# Altium footprint library B105connectors.PcbLib: 71 footprints (part 3 of 5)
Each footprint in its own frame and in the unit in brackets; x right, y up, seen from the top. Pads: shape width x height; smd on the part's side, far side on the other; paste and mask are expansions set on the pad; w line width, h text height; cw(c..) or ccw(c..) is an arc to the next point about the centre after c.
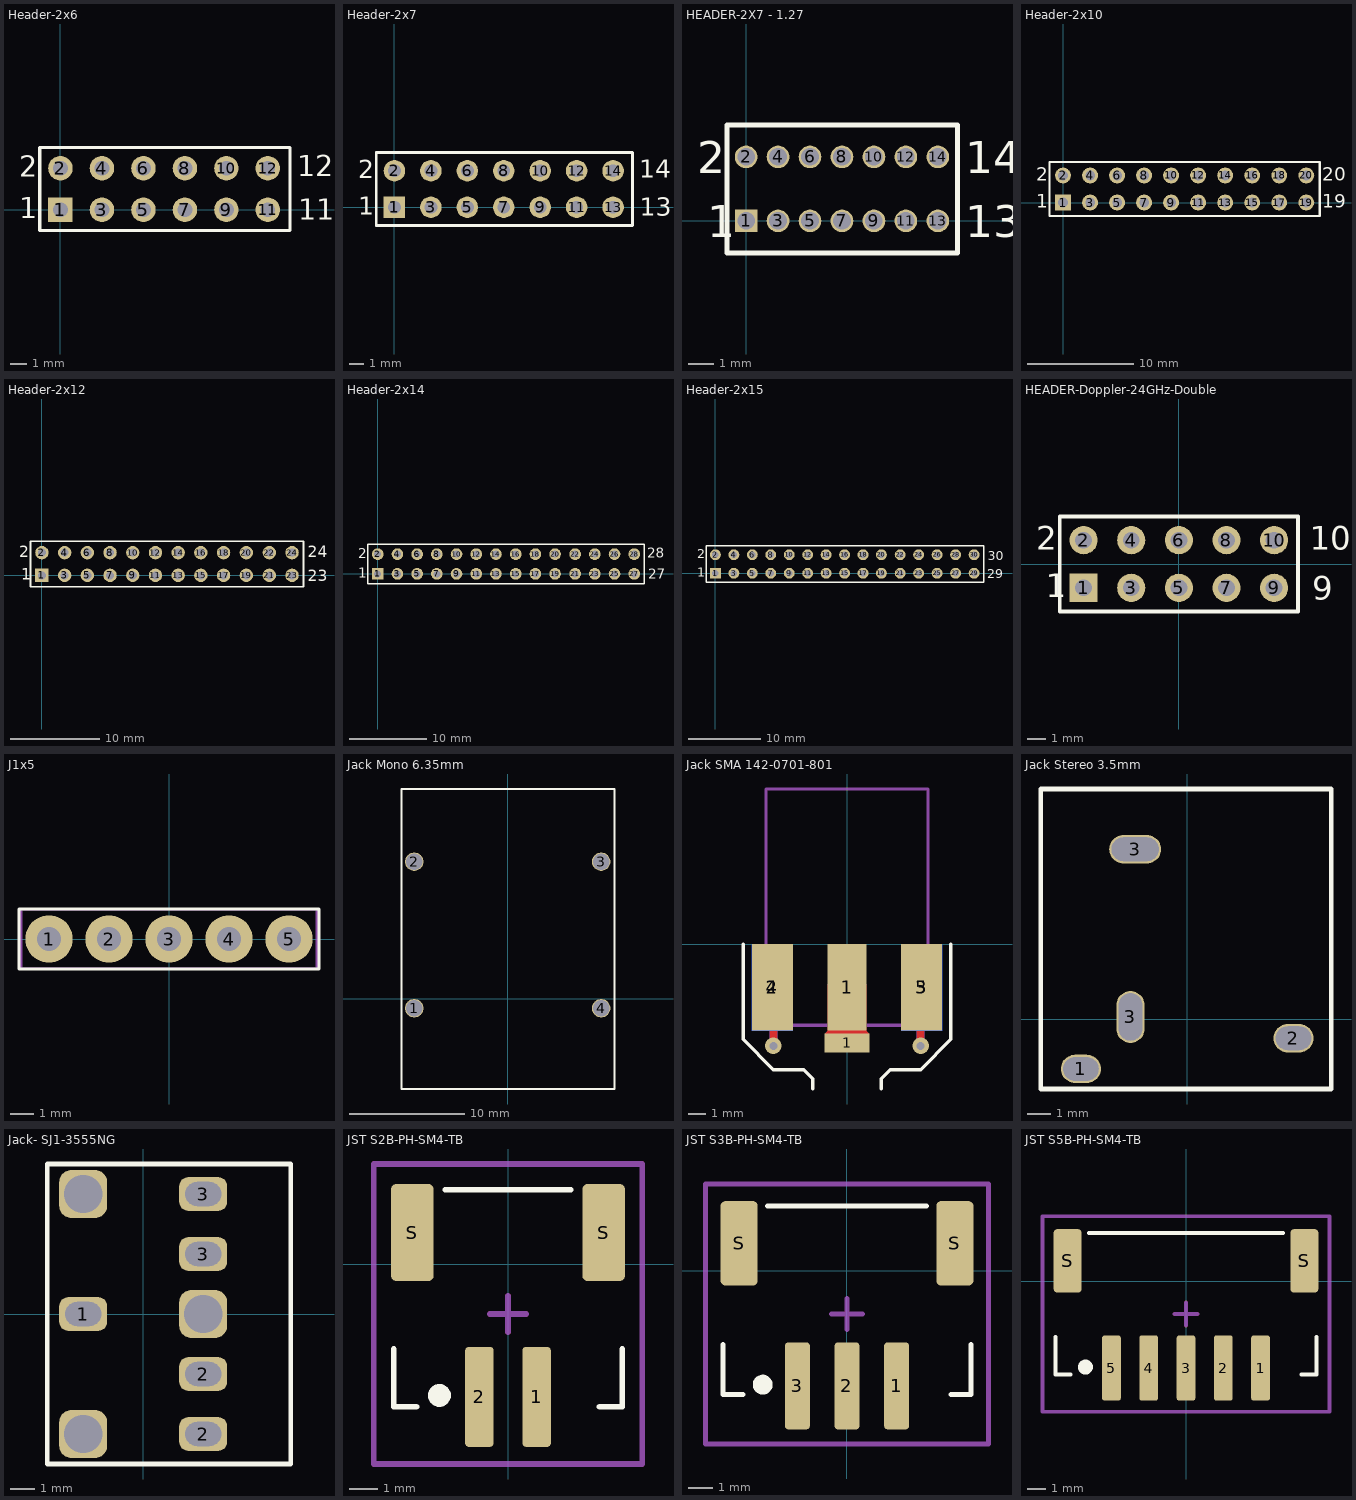
[diagram p2: the footprints below, top view; thin cyan lines are the x and y axes]

## Header-2x6 [mm] "Connector; Header; 6x2 Position"
pads (12):
  rect 1.5x1.5 hole 0.9: 1(0,0)
  round 1.5 hole 0.9: 2(0,2.54) 3(2.54,0) 4(2.54,2.54) 5(5.08,0) 6(5.08,2.54) 7(7.62,0) 8(7.62,2.54) 9(10.16,0) 10(10.16,2.54) 11(12.7,0) 12(12.7,2.54)
Top Overlay:
  lines w0.2: -1.27,-1.27 -1.27,3.81 0.635,3.81 14.06,3.81 14.06,-1.27 0.635,-1.27 -1.27,-1.27
  text "2" at -2.54,2.032 h1.27
  text "1" at -2.54,-0.508 h1.27
  text "11" at 14.56,-0.6 h1.27
  text "12" at 14.51,2.05 h1.27
3D body "User Library-Header_Male_1Pin.STEP": height 8.54, standoff -3, extent 8.88,1.26 11.42,3.75
3D body "User Library-Header_Male_1Pin.STEP": height 8.54, standoff -3, extent 11.43,1.26 13.97,3.75
3D body "User Library-Header_Male_1Pin.STEP": height 8.54, standoff -3, extent 8.88,-1.24 11.42,1.25
3D body "User Library-Header_Male_1Pin.STEP": height 8.54, standoff -3, extent 11.43,-1.24 13.97,1.25
3D body "User Library-Header_Male_1Pin.STEP": height 8.54, standoff -3, extent 3.78,1.26 6.32,3.75
3D body "User Library-Header_Male_1Pin.STEP": height 8.54, standoff -3, extent 6.33,1.26 8.87,3.75
3D body "User Library-Header_Male_1Pin.STEP": height 8.54, standoff -3, extent 3.78,-1.24 6.32,1.25
3D body "User Library-Header_Male_1Pin.STEP": height 8.54, standoff -3, extent 6.33,-1.24 8.87,1.25
3D body "User Library-Header_Male_1Pin.STEP": height 8.54, standoff -3, extent -1.32,1.26 1.22,3.75
3D body "User Library-Header_Male_1Pin.STEP": height 8.54, standoff -3, extent 1.23,1.26 3.77,3.75
3D body "User Library-Header_Male_1Pin.STEP": height 8.54, standoff -3, extent -1.32,-1.24 1.22,1.25
3D body "User Library-Header_Male_1Pin.STEP": height 8.54, standoff -3, extent 1.23,-1.24 3.77,1.25

## Header-2x7 [mm] "Connector; Header; 7x2 Position"
pads (14):
  rect 1.5x1.5 hole 0.9: 1(0,0)
  round 1.5 hole 0.9: 2(0,2.54) 3(2.54,0) 4(2.54,2.54) 5(5.08,0) 6(5.08,2.54) 7(7.62,0) 8(7.62,2.54) 9(10.16,0) 10(10.16,2.54) 11(12.7,0) 12(12.7,2.54) 13(15.24,0) 14(15.24,2.54)
Top Overlay:
  lines w0.2: -1.27,-1.27 -1.27,3.81 0.635,3.81 16.6,3.81 16.6,-1.27 0.635,-1.27 -1.27,-1.27
  text "2" at -2.54,2.032 h1.27
  text "1" at -2.54,-0.508 h1.27
  text "13" at 17.1,-0.6 h1.27
  text "14" at 17.05,2.05 h1.27
3D body "User Library-Header_Male_1Pin.STEP": height 8.54, standoff -3, extent 13.98,1.26 16.52,3.75
3D body "User Library-Header_Male_1Pin.STEP": height 8.54, standoff -3, extent 13.98,-1.24 16.52,1.25
3D body "User Library-Header_Male_1Pin.STEP": height 8.54, standoff -3, extent 8.88,1.26 11.42,3.75
3D body "User Library-Header_Male_1Pin.STEP": height 8.54, standoff -3, extent 11.43,1.26 13.97,3.75
3D body "User Library-Header_Male_1Pin.STEP": height 8.54, standoff -3, extent 8.88,-1.24 11.42,1.25
3D body "User Library-Header_Male_1Pin.STEP": height 8.54, standoff -3, extent 11.43,-1.24 13.97,1.25
3D body "User Library-Header_Male_1Pin.STEP": height 8.54, standoff -3, extent 3.78,1.26 6.32,3.75
3D body "User Library-Header_Male_1Pin.STEP": height 8.54, standoff -3, extent 6.33,1.26 8.87,3.75
3D body "User Library-Header_Male_1Pin.STEP": height 8.54, standoff -3, extent 3.78,-1.24 6.32,1.25
3D body "User Library-Header_Male_1Pin.STEP": height 8.54, standoff -3, extent 6.33,-1.24 8.87,1.25
3D body "User Library-Header_Male_1Pin.STEP": height 8.54, standoff -3, extent -1.32,1.26 1.22,3.75
3D body "User Library-Header_Male_1Pin.STEP": height 8.54, standoff -3, extent 1.23,1.26 3.77,3.75
3D body "User Library-Header_Male_1Pin.STEP": height 8.54, standoff -3, extent -1.32,-1.24 1.22,1.25
3D body "User Library-Header_Male_1Pin.STEP": height 8.54, standoff -3, extent 1.23,-1.24 3.77,1.25

## HEADER-2X7 - 1.27 [mm] "Connector; Header; 4x2 Position"
pads (14):
  rect 0.9x0.9 hole 0.7: 1(0,0)
  round 0.9 hole 0.7: 2(0,2.54) 3(1.27,0) 4(1.27,2.54) 5(2.54,0) 6(2.54,2.54) 7(3.81,0) 8(3.81,2.54) 9(5.08,0) 10(5.08,2.54) 11(6.35,0) 12(6.35,2.54) 13(7.62,0) 14(7.62,2.54)
Top Overlay:
  lines w0.2: -0.75,-1.27 -0.75,3.8 8.4,3.8 8.4,-1.27 -0.75,-1.27
  text "14" at 8.7,1.9 h1.27
  text "13" at 8.7,-0.65 h1.27
  text "1" at -1.55,-0.65 h1.27
  text "2" at -1.95,1.9 h1.27

## Header-2x10 [mm] "Connector; Header; 10x2 Position"
pads (20):
  rect 1.5x1.5 hole 0.9: 1(0,0)
  round 1.5 hole 0.9: 2(0,2.54) 3(2.54,0) 4(2.54,2.54) 5(5.08,0) 6(5.08,2.54) 7(7.62,0) 8(7.62,2.54) 9(10.16,0) 10(10.16,2.54) 11(12.7,0) 12(12.7,2.54) 13(15.24,0) 14(15.24,2.54) 15(17.78,0) 16(17.78,2.54) 17(20.32,0) 18(20.32,2.54) 19(22.86,0) 20(22.86,2.54)
Top Overlay:
  lines w0.2: -1.27,-1.27 0.635,-1.27 24.13,-1.27 24.13,3.81 0.635,3.81 -1.27,3.81 -1.27,-1.27
  text "20" at 24.384,2.032 h1.27
  text "19" at 24.384,-0.508 h1.27
  text "1" at -2.54,-0.508 h1.27
  text "2" at -2.54,2.032 h1.27
3D body "User Library-Header_Male_1Pin.STEP": height 8.54, standoff -3, extent 1.23,-1.24 3.77,1.25
3D body "User Library-Header_Male_1Pin.STEP": height 8.54, standoff -3, extent -1.32,-1.24 1.22,1.25
3D body "User Library-Header_Male_1Pin.STEP": height 8.54, standoff -3, extent 1.23,1.26 3.77,3.75
3D body "User Library-Header_Male_1Pin.STEP": height 8.54, standoff -3, extent -1.32,1.26 1.22,3.75
3D body "User Library-Header_Male_1Pin.STEP": height 8.54, standoff -3, extent 6.33,-1.24 8.87,1.25
3D body "User Library-Header_Male_1Pin.STEP": height 8.54, standoff -3, extent 3.78,-1.24 6.32,1.25
3D body "User Library-Header_Male_1Pin.STEP": height 8.54, standoff -3, extent 6.33,1.26 8.87,3.75
3D body "User Library-Header_Male_1Pin.STEP": height 8.54, standoff -3, extent 3.78,1.26 6.32,3.75
3D body "User Library-Header_Male_1Pin.STEP": height 8.54, standoff -3, extent 11.43,-1.24 13.97,1.25
3D body "User Library-Header_Male_1Pin.STEP": height 8.54, standoff -3, extent 8.88,-1.24 11.42,1.25
3D body "User Library-Header_Male_1Pin.STEP": height 8.54, standoff -3, extent 11.43,1.26 13.97,3.75
3D body "User Library-Header_Male_1Pin.STEP": height 8.54, standoff -3, extent 8.88,1.26 11.42,3.75
3D body "User Library-Header_Male_1Pin.STEP": height 8.54, standoff -3, extent 16.53,-1.24 19.07,1.25
3D body "User Library-Header_Male_1Pin.STEP": height 8.54, standoff -3, extent 13.98,-1.24 16.52,1.25
3D body "User Library-Header_Male_1Pin.STEP": height 8.54, standoff -3, extent 16.53,1.26 19.07,3.75
3D body "User Library-Header_Male_1Pin.STEP": height 8.54, standoff -3, extent 13.98,1.26 16.52,3.75
3D body "User Library-Header_Male_1Pin.STEP": height 8.54, standoff -3, extent 21.63,-1.24 24.17,1.25
3D body "User Library-Header_Male_1Pin.STEP": height 8.54, standoff -3, extent 19.08,-1.24 21.62,1.25
3D body "User Library-Header_Male_1Pin.STEP": height 8.54, standoff -3, extent 21.63,1.26 24.17,3.75
3D body "User Library-Header_Male_1Pin.STEP": height 8.54, standoff -3, extent 19.08,1.26 21.62,3.75

## Header-2x12 [mm] "Connector; Header; 12x2 Position"
pads (24):
  rect 1.5x1.5 hole 0.9: 1(0,0)
  round 1.5 hole 0.9: 2(0,2.54) 3(2.54,0) 4(2.54,2.54) 5(5.08,0) 6(5.08,2.54) 7(7.62,0) 8(7.62,2.54) 9(10.16,0) 10(10.16,2.54) 11(12.7,0) 12(12.7,2.54) 13(15.24,0) 14(15.24,2.54) 15(17.78,0) 16(17.78,2.54) 17(20.32,0) 18(20.32,2.54) 19(22.86,0) 20(22.86,2.54) 21(25.44,0) 22(25.44,2.54) 23(27.98,0) 24(27.98,2.54)
Top Overlay:
  lines w0.2: -1.27,-1.27 -1.27,3.81 0.635,3.81 29.275,3.81 29.275,-1.27 0.635,-1.27 -1.27,-1.27
  text "2" at -2.565,2.032 h1.27
  text "1" at -2.34,-0.508 h1.27
  text "23" at 29.725,-0.65 h1.27
  text "24" at 29.725,2.05 h1.27
3D body "User Library-Header_Male_1Pin.STEP": height 8.54, standoff -3, extent 19.08,1.26 21.62,3.75
3D body "User Library-Header_Male_1Pin.STEP": height 8.54, standoff -3, extent 21.63,1.26 24.17,3.75
3D body "User Library-Header_Male_1Pin.STEP": height 8.54, standoff -3, extent 19.08,-1.24 21.62,1.25
3D body "User Library-Header_Male_1Pin.STEP": height 8.54, standoff -3, extent 21.63,-1.24 24.17,1.25
3D body "User Library-Header_Male_1Pin.STEP": height 8.54, standoff -3, extent 13.98,1.26 16.52,3.75
3D body "User Library-Header_Male_1Pin.STEP": height 8.54, standoff -3, extent 16.53,1.26 19.07,3.75
3D body "User Library-Header_Male_1Pin.STEP": height 8.54, standoff -3, extent 13.98,-1.24 16.52,1.25
3D body "User Library-Header_Male_1Pin.STEP": height 8.54, standoff -3, extent 16.53,-1.24 19.07,1.25
3D body "User Library-Header_Male_1Pin.STEP": height 8.54, standoff -3, extent 8.88,1.26 11.42,3.75
3D body "User Library-Header_Male_1Pin.STEP": height 8.54, standoff -3, extent 11.43,1.26 13.97,3.75
3D body "User Library-Header_Male_1Pin.STEP": height 8.54, standoff -3, extent 8.88,-1.24 11.42,1.25
3D body "User Library-Header_Male_1Pin.STEP": height 8.54, standoff -3, extent 11.43,-1.24 13.97,1.25
3D body "User Library-Header_Male_1Pin.STEP": height 8.54, standoff -3, extent 3.78,1.26 6.32,3.75
3D body "User Library-Header_Male_1Pin.STEP": height 8.54, standoff -3, extent 6.33,1.26 8.87,3.75
3D body "User Library-Header_Male_1Pin.STEP": height 8.54, standoff -3, extent 3.78,-1.24 6.32,1.25
3D body "User Library-Header_Male_1Pin.STEP": height 8.54, standoff -3, extent 6.33,-1.24 8.87,1.25
3D body "User Library-Header_Male_1Pin.STEP": height 8.54, standoff -3, extent -1.32,1.26 1.22,3.75
3D body "User Library-Header_Male_1Pin.STEP": height 8.54, standoff -3, extent 1.23,1.26 3.77,3.75
3D body "User Library-Header_Male_1Pin.STEP": height 8.54, standoff -3, extent -1.32,-1.24 1.22,1.25
3D body "User Library-Header_Male_1Pin.STEP": height 8.54, standoff -3, extent 1.23,-1.24 3.77,1.25
3D body "User Library-Header_Male_1Pin.STEP": height 8.54, standoff -3, extent 26.73,-1.24 29.27,1.25
3D body "User Library-Header_Male_1Pin.STEP": height 8.54, standoff -3, extent 24.18,-1.24 26.72,1.25
3D body "User Library-Header_Male_1Pin.STEP": height 8.54, standoff -3, extent 26.73,1.26 29.27,3.75
3D body "User Library-Header_Male_1Pin.STEP": height 8.54, standoff -3, extent 24.18,1.26 26.72,3.75

## Header-2x14 [mm] "Connector; Header; 10x2 Position"
pads (28):
  rect 1.5x1.5 hole 0.9: 1(0,0)
  round 1.5 hole 0.9: 2(0,2.54) 3(2.54,0) 4(2.54,2.54) 5(5.08,0) 6(5.08,2.54) 7(7.62,0) 8(7.62,2.54) 9(10.16,0) 10(10.16,2.54) 11(12.7,0) 12(12.7,2.54) 13(15.24,0) 14(15.24,2.54) 15(17.78,0) 16(17.78,2.54) 17(20.32,0) 18(20.32,2.54) 19(22.86,0) 20(22.86,2.54) 21(25.44,0) 22(25.44,2.54) 23(27.98,0) 24(27.98,2.54) 25(30.52,0) 26(30.52,2.54) 27(33.06,0) 28(33.06,2.54)
Top Overlay:
  lines w0.2: 34.3,3.81 0.635,3.81 -1.27,3.81 -1.27,-1.27 0.635,-1.27 34.33,-1.27 34.33,3.81
  text "2" at -2.54,2.032 h1.27
  text "1" at -2.54,-0.508 h1.27
  text "27" at 34.85,-0.65 h1.27
  text "28" at 34.75,2.05 h1.27
3D body "User Library-Header_Male_1Pin.STEP": height 8.54, standoff -3, extent 19.08,1.26 21.62,3.75
3D body "User Library-Header_Male_1Pin.STEP": height 8.54, standoff -3, extent 21.63,1.26 24.17,3.75
3D body "User Library-Header_Male_1Pin.STEP": height 8.54, standoff -3, extent 19.08,-1.24 21.62,1.25
3D body "User Library-Header_Male_1Pin.STEP": height 8.54, standoff -3, extent 21.63,-1.24 24.17,1.25
3D body "User Library-Header_Male_1Pin.STEP": height 8.54, standoff -3, extent 13.98,1.26 16.52,3.75
3D body "User Library-Header_Male_1Pin.STEP": height 8.54, standoff -3, extent 16.53,1.26 19.07,3.75
3D body "User Library-Header_Male_1Pin.STEP": height 8.54, standoff -3, extent 13.98,-1.24 16.52,1.25
3D body "User Library-Header_Male_1Pin.STEP": height 8.54, standoff -3, extent 16.53,-1.24 19.07,1.25
3D body "User Library-Header_Male_1Pin.STEP": height 8.54, standoff -3, extent 8.88,1.26 11.42,3.75
3D body "User Library-Header_Male_1Pin.STEP": height 8.54, standoff -3, extent 11.43,1.26 13.97,3.75
3D body "User Library-Header_Male_1Pin.STEP": height 8.54, standoff -3, extent 8.88,-1.24 11.42,1.25
3D body "User Library-Header_Male_1Pin.STEP": height 8.54, standoff -3, extent 11.43,-1.24 13.97,1.25
3D body "User Library-Header_Male_1Pin.STEP": height 8.54, standoff -3, extent 3.78,1.26 6.32,3.75
3D body "User Library-Header_Male_1Pin.STEP": height 8.54, standoff -3, extent 6.33,1.26 8.87,3.75
3D body "User Library-Header_Male_1Pin.STEP": height 8.54, standoff -3, extent 3.78,-1.24 6.32,1.25
3D body "User Library-Header_Male_1Pin.STEP": height 8.54, standoff -3, extent 6.33,-1.24 8.87,1.25
3D body "User Library-Header_Male_1Pin.STEP": height 8.54, standoff -3, extent -1.32,1.26 1.22,3.75
3D body "User Library-Header_Male_1Pin.STEP": height 8.54, standoff -3, extent 1.23,1.26 3.77,3.75
3D body "User Library-Header_Male_1Pin.STEP": height 8.54, standoff -3, extent -1.32,-1.24 1.22,1.25
3D body "User Library-Header_Male_1Pin.STEP": height 8.54, standoff -3, extent 1.23,-1.24 3.77,1.25
3D body "User Library-Header_Male_1Pin.STEP": height 8.54, standoff -3, extent 26.73,-1.24 29.27,1.25
3D body "User Library-Header_Male_1Pin.STEP": height 8.54, standoff -3, extent 24.18,-1.24 26.72,1.25
3D body "User Library-Header_Male_1Pin.STEP": height 8.54, standoff -3, extent 26.73,1.26 29.27,3.75
3D body "User Library-Header_Male_1Pin.STEP": height 8.54, standoff -3, extent 24.18,1.26 26.72,3.75
3D body "User Library-Header_Male_1Pin.STEP": height 8.54, standoff -3, extent 31.83,-1.24 34.37,1.25
3D body "User Library-Header_Male_1Pin.STEP": height 8.54, standoff -3, extent 29.28,-1.24 31.82,1.25
3D body "User Library-Header_Male_1Pin.STEP": height 8.54, standoff -3, extent 31.83,1.26 34.37,3.75
3D body "User Library-Header_Male_1Pin.STEP": height 8.54, standoff -3, extent 29.28,1.26 31.82,3.75

## Header-2x15 [mm] "Connector; Header; 10x2 Position"
pads (30):
  rect 1.5x1.5 hole 0.9: 1(0,0)
  round 1.5 hole 0.9: 2(0,2.54) 3(2.54,0) 4(2.54,2.54) 5(5.08,0) 6(5.08,2.54) 7(7.62,0) 8(7.62,2.54) 9(10.16,0) 10(10.16,2.54) 11(12.7,0) 12(12.7,2.54) 13(15.24,0) 14(15.24,2.54) 15(17.78,0) 16(17.78,2.54) 17(20.32,0) 18(20.32,2.54) 19(22.86,0) 20(22.86,2.54) 21(25.44,0) 22(25.44,2.54) 23(27.98,0) 24(27.98,2.54) 25(30.52,0) 26(30.52,2.54) 27(33.06,0) 28(33.06,2.54) 29(35.61,0) 30(35.61,2.54)
Top Overlay:
  lines w0.2: -1.27,-1.27 0.635,-1.27 36.95,-1.27 36.95,3.81 0.635,3.81 -1.27,3.81 -1.27,-1.27
  text "30" at 37.5,1.8 h1.27
  text "29" at 37.45,-0.7 h1.27
  text "1" at -2.54,-0.508 h1.27
  text "2" at -2.54,2.032 h1.27
3D body "User Library-Header_Male_1Pin.STEP": height 8.54, standoff -3, extent 34.38,-1.24 36.92,1.25
3D body "User Library-Header_Male_1Pin.STEP": height 8.54, standoff -3, extent 34.38,1.26 36.92,3.75
3D body "User Library-Header_Male_1Pin.STEP": height 8.54, standoff -3, extent 29.28,1.26 31.82,3.75
3D body "User Library-Header_Male_1Pin.STEP": height 8.54, standoff -3, extent 31.83,1.26 34.37,3.75
3D body "User Library-Header_Male_1Pin.STEP": height 8.54, standoff -3, extent 29.28,-1.24 31.82,1.25
3D body "User Library-Header_Male_1Pin.STEP": height 8.54, standoff -3, extent 31.83,-1.24 34.37,1.25
3D body "User Library-Header_Male_1Pin.STEP": height 8.54, standoff -3, extent 24.18,1.26 26.72,3.75
3D body "User Library-Header_Male_1Pin.STEP": height 8.54, standoff -3, extent 26.73,1.26 29.27,3.75
3D body "User Library-Header_Male_1Pin.STEP": height 8.54, standoff -3, extent 24.18,-1.24 26.72,1.25
3D body "User Library-Header_Male_1Pin.STEP": height 8.54, standoff -3, extent 26.73,-1.24 29.27,1.25
3D body "User Library-Header_Male_1Pin.STEP": height 8.54, standoff -3, extent 1.23,-1.24 3.77,1.25
3D body "User Library-Header_Male_1Pin.STEP": height 8.54, standoff -3, extent -1.32,-1.24 1.22,1.25
3D body "User Library-Header_Male_1Pin.STEP": height 8.54, standoff -3, extent 1.23,1.26 3.77,3.75
3D body "User Library-Header_Male_1Pin.STEP": height 8.54, standoff -3, extent -1.32,1.26 1.22,3.75
3D body "User Library-Header_Male_1Pin.STEP": height 8.54, standoff -3, extent 6.33,-1.24 8.87,1.25
3D body "User Library-Header_Male_1Pin.STEP": height 8.54, standoff -3, extent 3.78,-1.24 6.32,1.25
3D body "User Library-Header_Male_1Pin.STEP": height 8.54, standoff -3, extent 6.33,1.26 8.87,3.75
3D body "User Library-Header_Male_1Pin.STEP": height 8.54, standoff -3, extent 3.78,1.26 6.32,3.75
3D body "User Library-Header_Male_1Pin.STEP": height 8.54, standoff -3, extent 11.43,-1.24 13.97,1.25
3D body "User Library-Header_Male_1Pin.STEP": height 8.54, standoff -3, extent 8.88,-1.24 11.42,1.25
3D body "User Library-Header_Male_1Pin.STEP": height 8.54, standoff -3, extent 11.43,1.26 13.97,3.75
3D body "User Library-Header_Male_1Pin.STEP": height 8.54, standoff -3, extent 8.88,1.26 11.42,3.75
3D body "User Library-Header_Male_1Pin.STEP": height 8.54, standoff -3, extent 16.53,-1.24 19.07,1.25
3D body "User Library-Header_Male_1Pin.STEP": height 8.54, standoff -3, extent 13.98,-1.24 16.52,1.25
3D body "User Library-Header_Male_1Pin.STEP": height 8.54, standoff -3, extent 16.53,1.26 19.07,3.75
3D body "User Library-Header_Male_1Pin.STEP": height 8.54, standoff -3, extent 13.98,1.26 16.52,3.75
3D body "User Library-Header_Male_1Pin.STEP": height 8.54, standoff -3, extent 21.63,-1.24 24.17,1.25
3D body "User Library-Header_Male_1Pin.STEP": height 8.54, standoff -3, extent 19.08,-1.24 21.62,1.25
3D body "User Library-Header_Male_1Pin.STEP": height 8.54, standoff -3, extent 21.63,1.26 24.17,3.75
3D body "User Library-Header_Male_1Pin.STEP": height 8.54, standoff -3, extent 19.08,1.26 21.62,3.75

## HEADER-Doppler-24GHz-Double [mm]
pads (10):
  rect 1.5x1.5 hole 0.9: 1(-5.08,-1.27)
  round 1.5 hole 0.9: 2(-5.08,1.27) 3(-2.54,-1.27) 4(-2.54,1.27) 5(0,-1.27) 6(0,1.27) 7(2.54,-1.27) 8(2.54,1.27) 9(5.08,-1.27) 10(5.08,1.27)
Top Overlay:
  lines w0.2: -6.35,-2.54 6.35,-2.54 6.35,2.54 -6.35,2.54 -6.35,-2.54
  text "2" at -7.62,0.762 h1.27
  text "1" at -7.112,-1.778 h1.27
  text "9" at 7.112,-1.905 h1.27
  text "10" at 6.985,0.762 h1.27
3D body "User Library-Header_Male_5Pin.STEP": height 8.54, standoff -3, extent -6.35,0.025 6.35,2.515
3D body "User Library-Header_Male_RA_Low_5Pin.STEP": height 2.51, standoff -3, extent -6.35,-11.08 6.35,-0.95

## J1x5 [mm]
pads (5):
  round 2 hole 1: 1(-5.08,0) 2(-2.54,0) 3(0,0) 4(2.54,0) 5(5.08,0)
Top Overlay:
  lines w0.127: -6.35,-1.27 -6.35,1.27 6.35,1.27 6.35,-1.27 -6.35,-1.27
Mechanical 5:
  lines w0.1: -6.25,-1.25 6.25,-1.25 6.25,1.25 -6.25,1.25 -6.25,-1.25
  text ".Designator" at -1.3,-0.5 h1
3D body "HN-1x5.STEP": height 10.1, standoff -1.5, extent -6.35,-1.27 6.35,1.27

## Jack Mono 6.35mm [mm]
pads (4):
  round 1.6 hole 1.4: 1(-8.1,-0.8) 2(-8.1,11.9) 3(8.1,11.9) 4(8.1,-0.8)
Top Overlay:
  lines w0.2: -9.2,-7.8 -9.2,18.2 9.25,18.2 9.25,-7.8 -9.2,-7.8
3D body "SW3dPS-NMJ4HCD2.STEP": height 17.8, standoff -2.14, extent -9.05,-7.647 9.15,24.147

## Jack SMA 142-0701-801 [mil] "SMA 50 Ohm End Launch Jack Receptacle - Round Contact"
height 311.81
pads (6):
  rect 103x43.5 smd: 1(0,-228.25)
  rect 90x200 smd: 1(0,-100)
  rect 95x200 smd: 2(-172.5,-100) 3(172.5,-100)
  rect 95x200 smd far side: 4(-172.5,-100) 5(172.5,-100)
via -170,-235 diameter 38 hole 18
via 170,-235 diameter 38 hole 18
Top Layer:
  region: -45,-200 45,-200 51.5,-206.5 51.5,-206.54 -51.5,-206.54 -51.5,-206.5
  lines w18: 170,-235 170,-102.5 ; -170,-235 -170,-102.5 -170,-235
  lines w90: 0,-202.58 0,-100
Bottom Layer:
  lines w18: -170,-235 -170,-102.5 ; 170,-235 170,-102.5
Top Overlay:
  lines w7.87: -240,0 -240,-220 -170,-290 -100,-290 -78.86,-311.14 ; -78.74,-334.65 -78.74,-311.26 ; 78.74,-334.65 78.74,-311.26 ; 78.86,-311.14 100,-290 170,-290 240,-220 240,0
Mechanical 13:
  lines w7.87: -187.01,-187.01 187.01,-187.01 187.01,358.27 -187.01,358.27 -187.01,-187.01
3D body "JackSMA_142-0701-801.step": height 155.91, standoff -155.91, extent -187.4,-187.01 187.41,357.48

## Jack Stereo 3.5mm [mm]
pads (4):
  oval 1.7x1.2 hole 1 slot 1.5 at 0 deg: 1(-4.5,-2.1) 2(4.5,-0.8)
  oval 1.2x2.2 hole 1 slot 2 at 90 deg: 3(-2.4,0.1)
  oval 2.2x1.2 hole 1 slot 2 at 0 deg: 3(-2.2,7.2)
Top Overlay:
  lines w0.2: -6.2,-2.95 6.1,-2.95 6.1,9.75 -6.2,9.75 -6.2,-2.95
3D body "Lumberg_KLBR_4.stp": height 6, standoff -3, extent -6.05,-2.417 5.95,13.165

## Jack- SJ1-3555NG [mm]
pads (8):
  rrect50% 2x1.4 hole 1 slot 1.5 at 0 deg: 1(-2.5,0) 2(2.5,-5) 2(2.5,-2.5) 3(2.5,2.5) 3(2.5,5)
  rrect50% 2x2 hole 1.6: ""(-2.5,-5) ""(-2.5,5) ""(2.5,0)
Top Overlay:
  lines w0.2: -4,-6.25 -4,6.25 6.15,6.25 6.15,-6.25 -4,-6.25
3D body "sj1-3555ng.stp": height 10, standoff -4, extent -9,-6 6,6

## JST S2B-PH-SM4-TB [mm]
pads (4):
  rrect25% 1x3.5 smd: 1(1,-4.65) 2(-1,-4.65)
  rrect25% 1.5x3.4 smd: S(-3.35,1.1) S(3.35,1.1)
Top Overlay:
  circle w0.4: c-2.4,-4.6 r0.2
  lines w0.2: -4,-2.975 -4,-5 -3.2,-5 ; -2.2,2.6 2.2,2.6 ; 3.2,-5 4,-5 4,-2.975
Mechanical 5:
  circle w0.254: c-2.4,-4.6 r0.1
Mechanical 15:
  lines w0.2: -0.635,-1.75 0.635,-1.75 ; 0,-2.385 0,-1.115 ; 4.699,-7 4.699,3.5 ; 4.7,-7 -4.699,-7 -4.699,3.5 4.7,3.5
3D body "S2B-PH-SM4-TB.STEP": height 5.5, standoff -0.1, extent -3.95,-6 3.95,2.6

## JST S3B-PH-SM4-TB [mm]
pads (5):
  rrect25% 1x3.5 smd: 1(2,-4.65) 2(0,-4.65) 3(-2,-4.65)
  rrect25% 1.5x3.4 smd: S(-4.35,1.1) S(4.35,1.1)
Top Overlay:
  circle w0.4: c-3.4,-4.6 r0.2
  lines w0.2: -5,-2.975 -5,-5 -4.2,-5 ; -3.2,2.6 3.2,2.6 ; 4.2,-5 5,-5 5,-2.975
Mechanical 5:
  circle w0.254: c-3.4,-4.6 r0.1
Mechanical 15:
  lines w0.2: -0.635,-1.75 0.635,-1.75 ; 0,-2.385 0,-1.115 ; -5.699,-7 -5.699,3.5 5.699,3.5 5.699,-7 -5.699,-7
3D body "S3B-PH-SM4-TB.STEP": height 5.6, standoff 0, extent -4.95,-6 4.95,2.6

## JST S5B-PH-SM4-TB [mm]
pads (7):
  rrect25% 1x3.5 smd: 1(4,-4.65) 2(2,-4.65) 3(0,-4.65) 4(-2,-4.65) 5(-4,-4.65)
  rrect25% 1.5x3.4 smd: S(-6.35,1.1) S(6.35,1.1)
Top Overlay:
  circle w0.4: c-5.4,-4.6 r0.2
  lines w0.2: -7,-2.975 -7,-5 -6.2,-5 ; -5.2,2.6 5.2,2.6 ; 6.2,-5 7,-5 7,-2.975
Mechanical 5:
  circle w0.254: c-5.4,-4.6 r0.1
Mechanical 15:
  lines w0.2: -0.635,-1.75 0.635,-1.75 ; 0,-2.385 0,-1.115 ; -7.699,-7 7.699,-7 7.699,3.5 -7.699,3.5 -7.699,-7
3D body "S5B-PH-SM4-TB.STEP": height 5.6, standoff 0, extent -6.95,-6 6.95,2.6